# Altium footprint library Package_DFN_QFN.PcbLib: 557 footprints (part 28 of 35)
Each footprint in its own frame and in the unit in brackets; x right, y up, seen from the top. Pads: shape width x height; smd on the part's side, far side on the other; paste and mask are expansions set on the pad; w line width, h text height; cw(c..) or ccw(c..) is an arc to the next point about the centre after c.
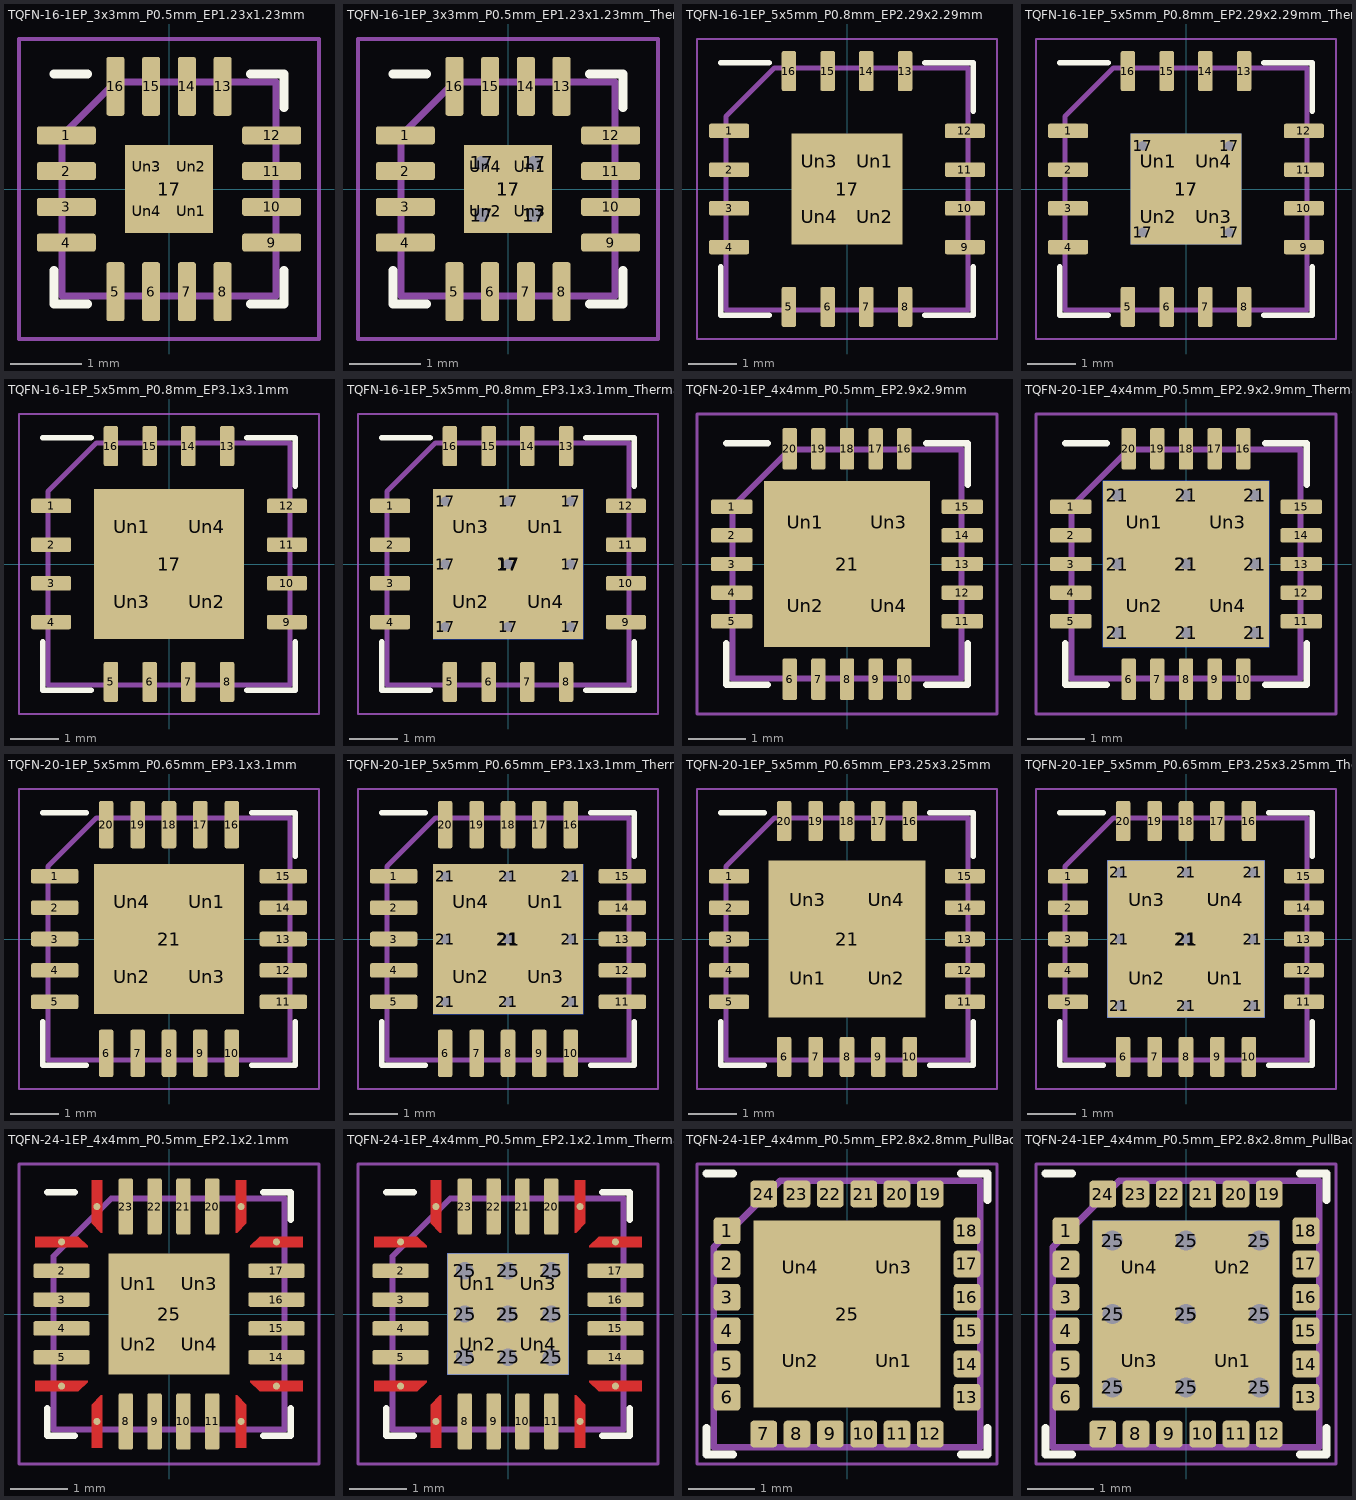
[diagram p27: the footprints below, top view; thin cyan lines are the x and y axes]

## TQFN-16-1EP_3x3mm_P0.5mm_EP1.23x1.23mm [mm]
pads (21):
  rrect25% 0.825x0.25 smd: 1(-1.438,0.75) 2(-1.438,0.25) 3(-1.438,-0.25) 4(-1.438,-0.75) 9(1.438,-0.75) 10(1.438,-0.25) 11(1.438,0.25) 12(1.438,0.75)
  rrect25% 0.25x0.825 smd: 5(-0.75,-1.438) 6(-0.25,-1.438) 7(0.25,-1.438) 8(0.75,-1.438) 13(0.75,1.438) 14(0.25,1.438) 15(-0.25,1.438) 16(-0.75,1.438)
  rect 1.23x1.23 smd: 17(0,0)
  rrect25% 0.5x0.5 on Top Paste: Un1(0.31,-0.31) Un2(0.31,0.31) Un3(-0.31,0.31) Un4(-0.31,-0.31)
F.SilkS:
  lines w0.12: -1.61,-1.135 -1.61,-1.61 -1.135,-1.61 ; -1.61,1.61 -1.135,1.61 ; 1.135,-1.61 1.61,-1.61 1.61,-1.135 ; 1.135,1.61 1.61,1.61 1.61,1.135
F.CrtYd:
  lines w0.05: -2.1,-2.1 -2.1,2.1 2.1,2.1 2.1,-2.1 -2.1,-2.1
F.Fab:
  lines w0.1: -1.5,-1.5 -1.5,0.75 -0.75,1.5 1.5,1.5 1.5,-1.5 -1.5,-1.5
  text "'.Designator'" at -3.033,-0.628 h0.75

## TQFN-16-1EP_3x3mm_P0.5mm_EP1.23x1.23mm_ThermalVias [mm]
pads (26):
  rrect25% 0.825x0.25 smd: 1(-1.438,0.75) 2(-1.438,0.25) 3(-1.438,-0.25) 4(-1.438,-0.75) 9(1.438,-0.75) 10(1.438,-0.25) 11(1.438,0.25) 12(1.438,0.75)
  rrect25% 0.25x0.825 smd: 5(-0.75,-1.438) 6(-0.25,-1.438) 7(0.25,-1.438) 8(0.75,-1.438) 13(0.75,1.438) 14(0.25,1.438) 15(-0.25,1.438) 16(-0.75,1.438)
  round 0.5 hole 0.2: 17(-0.365,-0.365) 17(-0.365,0.365) 17(0.365,-0.365) 17(0.365,0.365)
  rect 1.23x1.23 smd: 17(0,0)
  rect 1.23x1.23 smd far side: 17(0,0)
  rrect25% 0.53x0.53 on Top Paste: Un1(0.31,0.31) Un2(-0.31,-0.31) Un3(0.31,-0.31) Un4(-0.31,0.31)
F.SilkS:
  lines w0.12: -1.61,-1.135 -1.61,-1.61 -1.135,-1.61 ; -1.61,1.61 -1.135,1.61 ; 1.135,-1.61 1.61,-1.61 1.61,-1.135 ; 1.135,1.61 1.61,1.61 1.61,1.135
F.CrtYd:
  lines w0.05: -2.1,-2.1 -2.1,2.1 2.1,2.1 2.1,-2.1 -2.1,-2.1
F.Fab:
  lines w0.1: -1.5,-1.5 1.5,-1.5 1.5,1.5 -0.75,1.5 -1.5,0.75 -1.5,-1.5
  text "'.Designator'" at -3.033,-0.628 h0.75

## TQFN-16-1EP_5x5mm_P0.8mm_EP2.29x2.29mm [mm]
pads (21):
  rrect25% 0.825x0.3 smd: 1(-2.438,1.2) 2(-2.438,0.4) 3(-2.438,-0.4) 4(-2.438,-1.2) 9(2.438,-1.2) 10(2.438,-0.4) 11(2.438,0.4) 12(2.438,1.2)
  rrect25% 0.3x0.825 smd: 5(-1.2,-2.438) 6(-0.4,-2.438) 7(0.4,-2.438) 8(1.2,-2.438) 13(1.2,2.438) 14(0.4,2.438) 15(-0.4,2.438) 16(-1.2,2.438)
  rect 2.29x2.29 smd: 17(0,0)
  rrect25% 0.92x0.92 on Top Paste: Un1(0.57,0.57) Un2(0.57,-0.57) Un3(-0.57,0.57) Un4(-0.57,-0.57)
F.SilkS:
  lines w0.12: -2.61,-1.61 -2.61,-2.61 -1.61,-2.61 ; -2.61,2.61 -1.61,2.61 ; 1.61,-2.61 2.61,-2.61 2.61,-1.61 ; 1.61,2.61 2.61,2.61 2.61,1.61
F.CrtYd:
  lines w0.05: -3.1,-3.1 -3.1,3.1 3.1,3.1 3.1,-3.1 -3.1,-3.1
F.Fab:
  lines w0.1: -2.5,-2.5 2.5,-2.5 2.5,2.5 -1.5,2.5 -2.5,1.5 -2.5,-2.5
  text "'.Designator'" at -4.047,-0.84 h1

## TQFN-16-1EP_5x5mm_P0.8mm_EP2.29x2.29mm_ThermalVias [mm]
pads (26):
  rrect25% 0.825x0.3 smd: 1(-2.438,1.2) 2(-2.438,0.4) 3(-2.438,-0.4) 4(-2.438,-1.2) 9(2.438,-1.2) 10(2.438,-0.4) 11(2.438,0.4) 12(2.438,1.2)
  rrect25% 0.3x0.825 smd: 5(-1.2,-2.438) 6(-0.4,-2.438) 7(0.4,-2.438) 8(1.2,-2.438) 13(1.2,2.438) 14(0.4,2.438) 15(-0.4,2.438) 16(-1.2,2.438)
  round 0.5 hole 0.2: 17(-0.895,-0.895) 17(-0.895,0.895) 17(0.895,-0.895) 17(0.895,0.895)
  rect 2.29x2.29 smd far side: 17(0,0)
  rect 2.29x2.29 smd: 17(0,0)
  rrect25% 0.99x0.99 on Top Paste: Un1(-0.57,0.57) Un2(-0.57,-0.57) Un3(0.57,-0.57) Un4(0.57,0.57)
F.SilkS:
  lines w0.12: -2.61,-1.61 -2.61,-2.61 -1.61,-2.61 ; -2.61,2.61 -1.61,2.61 ; 1.61,-2.61 2.61,-2.61 2.61,-1.61 ; 1.61,2.61 2.61,2.61 2.61,1.61
F.CrtYd:
  lines w0.05: -3.1,-3.1 -3.1,3.1 3.1,3.1 3.1,-3.1 -3.1,-3.1
F.Fab:
  lines w0.1: -2.5,-2.5 -2.5,1.5 -1.5,2.5 2.5,2.5 2.5,-2.5 -2.5,-2.5
  text "'.Designator'" at -4.047,-0.84 h1

## TQFN-16-1EP_5x5mm_P0.8mm_EP3.1x3.1mm [mm]
pads (21):
  rrect25% 0.825x0.3 smd: 1(-2.438,1.2) 2(-2.438,0.4) 3(-2.438,-0.4) 4(-2.438,-1.2) 9(2.438,-1.2) 10(2.438,-0.4) 11(2.438,0.4) 12(2.438,1.2)
  rrect25% 0.3x0.825 smd: 5(-1.2,-2.438) 6(-0.4,-2.438) 7(0.4,-2.438) 8(1.2,-2.438) 13(1.2,2.438) 14(0.4,2.438) 15(-0.4,2.438) 16(-1.2,2.438)
  rect 3.1x3.1 smd: 17(0,0)
  rrect20% 1.25x1.25 on Top Paste: Un1(-0.775,0.775) Un2(0.775,-0.775) Un3(-0.775,-0.775) Un4(0.775,0.775)
F.SilkS:
  lines w0.12: -2.61,-1.61 -2.61,-2.61 -1.61,-2.61 ; -2.61,2.61 -1.61,2.61 ; 1.61,-2.61 2.61,-2.61 2.61,-1.61 ; 1.61,2.61 2.61,2.61 2.61,1.61
F.CrtYd:
  lines w0.05: -3.1,-3.1 3.1,-3.1 3.1,3.1 -3.1,3.1 -3.1,-3.1
F.Fab:
  lines w0.1: -2.5,-2.5 -2.5,1.5 -1.5,2.5 2.5,2.5 2.5,-2.5 -2.5,-2.5
  text "'.Designator'" at -4.047,-0.84 h1

## TQFN-16-1EP_5x5mm_P0.8mm_EP3.1x3.1mm_ThermalVias [mm]
pads (31):
  rrect25% 0.825x0.3 smd: 1(-2.438,1.2) 2(-2.438,0.4) 3(-2.438,-0.4) 4(-2.438,-1.2) 9(2.438,-1.2) 10(2.438,-0.4) 11(2.438,0.4) 12(2.438,1.2)
  rrect25% 0.3x0.825 smd: 5(-1.2,-2.438) 6(-0.4,-2.438) 7(0.4,-2.438) 8(1.2,-2.438) 13(1.2,2.438) 14(0.4,2.438) 15(-0.4,2.438) 16(-1.2,2.438)
  round 0.5 hole 0.2: 17(-1.3,-1.3) 17(-1.3,0) 17(-1.3,1.3) 17(0,-1.3) 17(0,0) 17(0,1.3) 17(1.3,-1.3) 17(1.3,0) 17(1.3,1.3)
  rect 3.1x3.1 smd: 17(0,0)
  rect 3.1x3.1 smd far side: 17(0,0)
  rrect19% 1.34x1.34 on Top Paste: Un1(0.775,0.775) Un2(-0.775,-0.775) Un3(-0.775,0.775) Un4(0.775,-0.775)
F.SilkS:
  lines w0.12: -2.61,-1.61 -2.61,-2.61 -1.61,-2.61 ; -2.61,2.61 -1.61,2.61 ; 1.61,-2.61 2.61,-2.61 2.61,-1.61 ; 1.61,2.61 2.61,2.61 2.61,1.61
F.CrtYd:
  lines w0.05: -3.1,-3.1 -3.1,3.1 3.1,3.1 3.1,-3.1 -3.1,-3.1
F.Fab:
  lines w0.1: -2.5,-2.5 2.5,-2.5 2.5,2.5 -1.5,2.5 -2.5,1.5 -2.5,-2.5
  text "'.Designator'" at -4.047,-0.84 h1

## TQFN-20-1EP_4x4mm_P0.5mm_EP2.9x2.9mm [mm]
pads (25):
  rrect25% 0.725x0.25 smd: 1(-2.013,1) 2(-2.013,0.5) 3(-2.013,0) 4(-2.013,-0.5) 5(-2.013,-1) 11(2.013,-1) 12(2.013,-0.5) 13(2.013,0) 14(2.013,0.5) 15(2.013,1)
  rrect25% 0.25x0.725 smd: 6(-1,-2.013) 7(-0.5,-2.013) 8(0,-2.013) 9(0.5,-2.013) 10(1,-2.013) 16(1,2.013) 17(0.5,2.013) 18(0,2.013) 19(-0.5,2.013) 20(-1,2.013)
  rect 2.9x2.9 smd: 21(0,0)
  rrect21% 1.17x1.17 on Top Paste: Un1(-0.725,0.725) Un2(-0.725,-0.725) Un3(0.725,0.725) Un4(0.725,-0.725)
F.SilkS:
  lines w0.12: -2.11,-1.385 -2.11,-2.11 -1.385,-2.11 ; -2.11,2.11 -1.385,2.11 ; 1.385,-2.11 2.11,-2.11 2.11,-1.385 ; 1.385,2.11 2.11,2.11 2.11,1.385
F.CrtYd:
  lines w0.05: -2.62,-2.62 -2.62,2.62 2.62,2.62 2.62,-2.62 -2.62,-2.62
F.Fab:
  lines w0.1: -2,-2 2,-2 2,2 -1,2 -2,1 -2,-2
  text "'.Designator'" at -4.047,-0.84 h1

## TQFN-20-1EP_4x4mm_P0.5mm_EP2.9x2.9mm_ThermalVias [mm]
pads (35):
  rrect25% 0.725x0.25 smd: 1(-2.013,1) 2(-2.013,0.5) 3(-2.013,0) 4(-2.013,-0.5) 5(-2.013,-1) 11(2.013,-1) 12(2.013,-0.5) 13(2.013,0) 14(2.013,0.5) 15(2.013,1)
  rrect25% 0.25x0.725 smd: 6(-1,-2.013) 7(-0.5,-2.013) 8(0,-2.013) 9(0.5,-2.013) 10(1,-2.013) 16(1,2.013) 17(0.5,2.013) 18(0,2.013) 19(-0.5,2.013) 20(-1,2.013)
  round 0.5 hole 0.2: 21(-1.2,-1.2) 21(-1.2,0) 21(-1.2,1.2) 21(0,-1.2) 21(0,0) 21(0,1.2) 21(1.2,-1.2) 21(1.2,0) 21(1.2,1.2)
  rect 2.9x2.9 smd: 21(0,0)
  rect 2.9x2.9 smd far side: 21(0,0)
  rrect20% 1.26x1.26 on Top Paste: Un1(-0.725,0.725) Un2(-0.725,-0.725) Un3(0.725,0.725) Un4(0.725,-0.725)
F.SilkS:
  lines w0.12: -2.11,-1.385 -2.11,-2.11 -1.385,-2.11 ; -2.11,2.11 -1.385,2.11 ; 1.385,-2.11 2.11,-2.11 2.11,-1.385 ; 1.385,2.11 2.11,2.11 2.11,1.385
F.CrtYd:
  lines w0.05: -2.62,-2.62 -2.62,2.62 2.62,2.62 2.62,-2.62 -2.62,-2.62
F.Fab:
  lines w0.1: -2,-2 2,-2 2,2 -1,2 -2,1 -2,-2
  text "'.Designator'" at -4.047,-0.84 h1

## TQFN-20-1EP_5x5mm_P0.65mm_EP3.1x3.1mm [mm]
pads (25):
  rrect25% 0.975x0.3 smd: 1(-2.362,1.3) 2(-2.362,0.65) 3(-2.362,0) 4(-2.362,-0.65) 5(-2.362,-1.3) 11(2.362,-1.3) 12(2.362,-0.65) 13(2.362,0) 14(2.362,0.65) 15(2.362,1.3)
  rrect25% 0.3x0.975 smd: 6(-1.3,-2.362) 7(-0.65,-2.362) 8(0,-2.362) 9(0.65,-2.362) 10(1.3,-2.362) 16(1.3,2.362) 17(0.65,2.362) 18(0,2.362) 19(-0.65,2.362) 20(-1.3,2.362)
  rect 3.1x3.1 smd: 21(0,0)
  rrect20% 1.25x1.25 on Top Paste: Un1(0.775,0.775) Un2(-0.775,-0.775) Un3(0.775,-0.775) Un4(-0.775,0.775)
F.SilkS:
  lines w0.12: -2.61,-1.71 -2.61,-2.61 -1.71,-2.61 ; -2.61,2.61 -1.71,2.61 ; 1.71,-2.61 2.61,-2.61 2.61,-1.71 ; 1.71,2.61 2.61,2.61 2.61,1.71
F.CrtYd:
  lines w0.05: -3.1,-3.1 3.1,-3.1 3.1,3.1 -3.1,3.1 -3.1,-3.1
F.Fab:
  lines w0.1: -2.5,-2.5 -2.5,1.5 -1.5,2.5 2.5,2.5 2.5,-2.5 -2.5,-2.5
  text "'.Designator'" at -4.047,-0.84 h1

## TQFN-20-1EP_5x5mm_P0.65mm_EP3.1x3.1mm_ThermalVias [mm]
pads (35):
  rrect25% 0.975x0.3 smd: 1(-2.362,1.3) 2(-2.362,0.65) 3(-2.362,0) 4(-2.362,-0.65) 5(-2.362,-1.3) 11(2.362,-1.3) 12(2.362,-0.65) 13(2.362,0) 14(2.362,0.65) 15(2.362,1.3)
  rrect25% 0.3x0.975 smd: 6(-1.3,-2.362) 7(-0.65,-2.362) 8(0,-2.362) 9(0.65,-2.362) 10(1.3,-2.362) 16(1.3,2.362) 17(0.65,2.362) 18(0,2.362) 19(-0.65,2.362) 20(-1.3,2.362)
  round 0.5 hole 0.2: 21(-1.3,-1.3) 21(-1.3,0) 21(-1.3,1.3) 21(0,-1.3) 21(0,0) 21(0,1.3) 21(1.3,-1.3) 21(1.3,0) 21(1.3,1.3)
  rect 3.1x3.1 smd: 21(0,0)
  rect 3.1x3.1 smd far side: 21(0,0)
  rrect19% 1.34x1.34 on Top Paste: Un1(0.775,0.775) Un2(-0.775,-0.775) Un3(0.775,-0.775) Un4(-0.775,0.775)
F.SilkS:
  lines w0.12: -2.61,-1.71 -2.61,-2.61 -1.71,-2.61 ; -2.61,2.61 -1.71,2.61 ; 1.71,-2.61 2.61,-2.61 2.61,-1.71 ; 1.71,2.61 2.61,2.61 2.61,1.71
F.CrtYd:
  lines w0.05: -3.1,-3.1 3.1,-3.1 3.1,3.1 -3.1,3.1 -3.1,-3.1
F.Fab:
  lines w0.1: -2.5,-2.5 2.5,-2.5 2.5,2.5 -1.5,2.5 -2.5,1.5 -2.5,-2.5
  text "'.Designator'" at -4.047,-0.84 h1

## TQFN-20-1EP_5x5mm_P0.65mm_EP3.25x3.25mm [mm]
pads (25):
  rrect25% 0.825x0.3 smd: 1(-2.438,1.3) 2(-2.438,0.65) 3(-2.438,0) 4(-2.438,-0.65) 5(-2.438,-1.3) 11(2.438,-1.3) 12(2.438,-0.65) 13(2.438,0) 14(2.438,0.65) 15(2.438,1.3)
  rrect25% 0.3x0.825 smd: 6(-1.3,-2.438) 7(-0.65,-2.438) 8(0,-2.438) 9(0.65,-2.438) 10(1.3,-2.438) 16(1.3,2.438) 17(0.65,2.438) 18(0,2.438) 19(-0.65,2.438) 20(-1.3,2.438)
  rect 3.25x3.25 smd: 21(0,0)
  rrect19% 1.31x1.31 on Top Paste: Un1(-0.81,-0.81) Un2(0.81,-0.81) Un3(-0.81,0.81) Un4(0.81,0.81)
F.SilkS:
  lines w0.12: -2.61,-1.71 -2.61,-2.61 -1.71,-2.61 ; -2.61,2.61 -1.71,2.61 ; 1.71,-2.61 2.61,-2.61 2.61,-1.71 ; 1.71,2.61 2.61,2.61 2.61,1.71
F.CrtYd:
  lines w0.05: -3.1,-3.1 -3.1,3.1 3.1,3.1 3.1,-3.1 -3.1,-3.1
F.Fab:
  lines w0.1: -2.5,-2.5 2.5,-2.5 2.5,2.5 -1.5,2.5 -2.5,1.5 -2.5,-2.5
  text "'.Designator'" at -4.047,-0.84 h1

## TQFN-20-1EP_5x5mm_P0.65mm_EP3.25x3.25mm_ThermalVias [mm]
pads (35):
  rrect25% 0.825x0.3 smd: 1(-2.438,1.3) 2(-2.438,0.65) 3(-2.438,0) 4(-2.438,-0.65) 5(-2.438,-1.3) 11(2.438,-1.3) 12(2.438,-0.65) 13(2.438,0) 14(2.438,0.65) 15(2.438,1.3)
  rrect25% 0.3x0.825 smd: 6(-1.3,-2.438) 7(-0.65,-2.438) 8(0,-2.438) 9(0.65,-2.438) 10(1.3,-2.438) 16(1.3,2.438) 17(0.65,2.438) 18(0,2.438) 19(-0.65,2.438) 20(-1.3,2.438)
  round 0.5 hole 0.2: 21(-1.375,-1.375) 21(-1.375,0) 21(-1.375,1.375) 21(0,-1.375) 21(0,0) 21(0,1.375) 21(1.375,-1.375) 21(1.375,0) 21(1.375,1.375)
  rect 3.25x3.25 smd far side: 21(0,0)
  rect 3.25x3.25 smd: 21(0,0)
  rrect18% 1.41x1.41 on Top Paste: Un1(0.81,-0.81) Un2(-0.81,-0.81) Un3(-0.81,0.81) Un4(0.81,0.81)
F.SilkS:
  lines w0.12: -2.61,-1.71 -2.61,-2.61 -1.71,-2.61 ; -2.61,2.61 -1.71,2.61 ; 1.71,-2.61 2.61,-2.61 2.61,-1.71 ; 1.71,2.61 2.61,2.61 2.61,1.71
F.CrtYd:
  lines w0.05: -3.1,-3.1 3.1,-3.1 3.1,3.1 -3.1,3.1 -3.1,-3.1
F.Fab:
  lines w0.1: -2.5,-2.5 -2.5,1.5 -1.5,2.5 2.5,2.5 2.5,-2.5 -2.5,-2.5
  text "'.Designator'" at -4.047,-0.84 h1

## TQFN-24-1EP_4x4mm_P0.5mm_EP2.1x2.1mm [mm]
pads (29):
  round 0.123 smd: 1(-1.863,1.25) 6(-1.863,-1.25) 7(-1.25,-1.863) 12(1.25,-1.863) 13(1.863,-1.25) 18(1.863,1.25) 19(1.25,1.863) 24(-1.25,1.863)
  rrect25% 0.975x0.25 smd: 2(-1.863,0.75) 3(-1.863,0.25) 4(-1.863,-0.25) 5(-1.863,-0.75) 14(1.863,-0.75) 15(1.863,-0.25) 16(1.863,0.25) 17(1.863,0.75)
  rrect25% 0.25x0.975 smd: 8(-0.75,-1.863) 9(-0.25,-1.863) 10(0.25,-1.863) 11(0.75,-1.863) 20(0.75,1.863) 21(0.25,1.863) 22(-0.25,1.863) 23(-0.75,1.863)
  rect 2.1x2.1 smd: 25(0,0)
  rrect25% 0.85x0.85 on Top Paste: Un1(-0.525,0.525) Un2(-0.525,-0.525) Un3(0.525,0.525) Un4(0.525,-0.525)
F.Cu:
  region: -1.41,1.181 -1.41,1.16 -2.315,1.16 -2.315,1.34 -1.569,1.34
  region: -1.41,-1.181 -1.569,-1.34 -2.315,-1.34 -2.315,-1.16 -1.41,-1.16
  region: -1.16,-2.315 -1.34,-2.315 -1.34,-1.569 -1.181,-1.41 -1.16,-1.41
  region: 1.34,-1.569 1.34,-2.315 1.16,-2.315 1.16,-1.41 1.181,-1.41
  region: 2.315,-1.34 1.569,-1.34 1.41,-1.181 1.41,-1.16 2.315,-1.16
  region: 2.315,1.16 1.41,1.16 1.41,1.181 1.569,1.34 2.315,1.34
  region: 1.34,1.569 1.181,1.41 1.16,1.41 1.16,2.315 1.34,2.315
  region: -1.16,1.41 -1.181,1.41 -1.34,1.569 -1.34,2.315 -1.16,2.315
F.SilkS:
  lines w0.12: -2.11,-1.635 -2.11,-2.11 -1.635,-2.11 ; -2.11,2.11 -1.635,2.11 ; 1.635,-2.11 2.11,-2.11 2.11,-1.635 ; 1.635,2.11 2.11,2.11 2.11,1.635
F.Paste:
  region: -1.41,1.181 -1.41,1.16 -2.315,1.16 -2.315,1.34 -1.569,1.34
  region: -1.41,-1.181 -1.569,-1.34 -2.315,-1.34 -2.315,-1.16 -1.41,-1.16
  region: -1.16,-2.315 -1.34,-2.315 -1.34,-1.569 -1.181,-1.41 -1.16,-1.41
  region: 1.34,-1.569 1.34,-2.315 1.16,-2.315 1.16,-1.41 1.181,-1.41
  region: 2.315,-1.34 1.569,-1.34 1.41,-1.181 1.41,-1.16 2.315,-1.16
  region: 2.315,1.16 1.41,1.16 1.41,1.181 1.569,1.34 2.315,1.34
  region: 1.34,1.569 1.181,1.41 1.16,1.41 1.16,2.315 1.34,2.315
  region: -1.16,1.41 -1.181,1.41 -1.34,1.569 -1.34,2.315 -1.16,2.315
F.Mask:
  region: -1.41,1.181 -1.41,1.16 -2.315,1.16 -2.315,1.34 -1.569,1.34
  region: -1.41,-1.181 -1.569,-1.34 -2.315,-1.34 -2.315,-1.16 -1.41,-1.16
  region: -1.16,-2.315 -1.34,-2.315 -1.34,-1.569 -1.181,-1.41 -1.16,-1.41
  region: 1.34,-1.569 1.34,-2.315 1.16,-2.315 1.16,-1.41 1.181,-1.41
  region: 2.315,-1.34 1.569,-1.34 1.41,-1.181 1.41,-1.16 2.315,-1.16
  region: 2.315,1.16 1.41,1.16 1.41,1.181 1.569,1.34 2.315,1.34
  region: 1.34,1.569 1.181,1.41 1.16,1.41 1.16,2.315 1.34,2.315
  region: -1.16,1.41 -1.181,1.41 -1.34,1.569 -1.34,2.315 -1.16,2.315
F.CrtYd:
  lines w0.05: -2.6,-2.6 -2.6,2.6 2.6,2.6 2.6,-2.6 -2.6,-2.6
F.Fab:
  lines w0.1: -2,-2 2,-2 2,2 -1,2 -2,1 -2,-2
  text "'.Designator'" at -4.047,-0.84 h1

## TQFN-24-1EP_4x4mm_P0.5mm_EP2.1x2.1mm_ThermalVias [mm]
pads (39):
  round 0.123 smd: 1(-1.863,1.25) 6(-1.863,-1.25) 7(-1.25,-1.863) 12(1.25,-1.863) 13(1.863,-1.25) 18(1.863,1.25) 19(1.25,1.863) 24(-1.25,1.863)
  rrect25% 0.975x0.25 smd: 2(-1.863,0.75) 3(-1.863,0.25) 4(-1.863,-0.25) 5(-1.863,-0.75) 14(1.863,-0.75) 15(1.863,-0.25) 16(1.863,0.25) 17(1.863,0.75)
  rrect25% 0.25x0.975 smd: 8(-0.75,-1.863) 9(-0.25,-1.863) 10(0.25,-1.863) 11(0.75,-1.863) 20(0.75,1.863) 21(0.25,1.863) 22(-0.25,1.863) 23(-0.75,1.863)
  round 0.6 hole 0.3: 25(-0.75,-0.75) 25(-0.75,0) 25(-0.75,0.75) 25(0,-0.75) 25(0,0) 25(0,0.75) 25(0.75,-0.75) 25(0.75,0) 25(0.75,0.75)
  rect 2.1x2.1 smd: 25(0,0)
  rect 2.1x2.1 smd far side: 25(0,0)
  rrect25% 0.85x0.85 on Top Paste: Un1(-0.525,0.525) Un2(-0.525,-0.525) Un3(0.525,0.525) Un4(0.525,-0.525)
F.Cu:
  region: -1.41,1.181 -1.41,1.16 -2.315,1.16 -2.315,1.34 -1.569,1.34
  region: -1.41,-1.181 -1.569,-1.34 -2.315,-1.34 -2.315,-1.16 -1.41,-1.16
  region: -1.16,-2.315 -1.34,-2.315 -1.34,-1.569 -1.181,-1.41 -1.16,-1.41
  region: 1.34,-1.569 1.34,-2.315 1.16,-2.315 1.16,-1.41 1.181,-1.41
  region: 2.315,-1.34 1.569,-1.34 1.41,-1.181 1.41,-1.16 2.315,-1.16
  region: 2.315,1.16 1.41,1.16 1.41,1.181 1.569,1.34 2.315,1.34
  region: 1.34,1.569 1.181,1.41 1.16,1.41 1.16,2.315 1.34,2.315
  region: -1.16,1.41 -1.181,1.41 -1.34,1.569 -1.34,2.315 -1.16,2.315
F.SilkS:
  lines w0.12: -2.11,-1.635 -2.11,-2.11 -1.635,-2.11 ; -2.11,2.11 -1.635,2.11 ; 1.635,-2.11 2.11,-2.11 2.11,-1.635 ; 1.635,2.11 2.11,2.11 2.11,1.635
F.Paste:
  region: -1.41,1.181 -1.41,1.16 -2.315,1.16 -2.315,1.34 -1.569,1.34
  region: -1.41,-1.181 -1.569,-1.34 -2.315,-1.34 -2.315,-1.16 -1.41,-1.16
  region: -1.16,-2.315 -1.34,-2.315 -1.34,-1.569 -1.181,-1.41 -1.16,-1.41
  region: 1.34,-1.569 1.34,-2.315 1.16,-2.315 1.16,-1.41 1.181,-1.41
  region: 2.315,-1.34 1.569,-1.34 1.41,-1.181 1.41,-1.16 2.315,-1.16
  region: 2.315,1.16 1.41,1.16 1.41,1.181 1.569,1.34 2.315,1.34
  region: 1.34,1.569 1.181,1.41 1.16,1.41 1.16,2.315 1.34,2.315
  region: -1.16,1.41 -1.181,1.41 -1.34,1.569 -1.34,2.315 -1.16,2.315
F.Mask:
  region: -1.41,1.181 -1.41,1.16 -2.315,1.16 -2.315,1.34 -1.569,1.34
  region: -1.41,-1.181 -1.569,-1.34 -2.315,-1.34 -2.315,-1.16 -1.41,-1.16
  region: -1.16,-2.315 -1.34,-2.315 -1.34,-1.569 -1.181,-1.41 -1.16,-1.41
  region: 1.34,-1.569 1.34,-2.315 1.16,-2.315 1.16,-1.41 1.181,-1.41
  region: 2.315,-1.34 1.569,-1.34 1.41,-1.181 1.41,-1.16 2.315,-1.16
  region: 2.315,1.16 1.41,1.16 1.41,1.181 1.569,1.34 2.315,1.34
  region: 1.34,1.569 1.181,1.41 1.16,1.41 1.16,2.315 1.34,2.315
  region: -1.16,1.41 -1.181,1.41 -1.34,1.569 -1.34,2.315 -1.16,2.315
F.CrtYd:
  lines w0.05: -2.6,-2.6 -2.6,2.6 2.6,2.6 2.6,-2.6 -2.6,-2.6
F.Fab:
  lines w0.1: -2,-2 2,-2 2,2 -1,2 -2,1 -2,-2
  text "'.Designator'" at -4.047,-0.84 h1

## TQFN-24-1EP_4x4mm_P0.5mm_EP2.8x2.8mm_PullBack [mm]
pads (29):
  rrect25% 0.4x0.4 smd: 1(-1.8,1.25) 2(-1.8,0.75) 3(-1.8,0.25) 4(-1.8,-0.25) 5(-1.8,-0.75) 6(-1.8,-1.25) 7(-1.25,-1.8) 8(-0.75,-1.8) 9(-0.25,-1.8) 10(0.25,-1.8) 11(0.75,-1.8) 12(1.25,-1.8) 13(1.8,-1.25) 14(1.8,-0.75) 15(1.8,-0.25) 16(1.8,0.25) 17(1.8,0.75) 18(1.8,1.25) 19(1.25,1.8) 20(0.75,1.8) 21(0.25,1.8) 22(-0.25,1.8) 23(-0.75,1.8) 24(-1.25,1.8)
  rect 2.8x2.8 smd: 25(0,0)
  rrect22% 1.13x1.13 on Top Paste: Un1(0.7,-0.7) Un2(-0.7,-0.7) Un3(0.7,0.7) Un4(-0.7,0.7)
F.SilkS:
  lines w0.12: -2.11,-1.71 -2.11,-2.11 -1.71,-2.11 ; -2.11,2.11 -1.71,2.11 ; 1.71,-2.11 2.11,-2.11 2.11,-1.71 ; 1.71,2.11 2.11,2.11 2.11,1.71
F.CrtYd:
  lines w0.05: -2.25,-2.25 -2.25,2.25 2.25,2.25 2.25,-2.25 -2.25,-2.25
F.Fab:
  lines w0.1: -2,-2 -2,1 -1,2 2,2 2,-2 -2,-2
  text "'.Designator'" at -4.047,-0.84 h1

## TQFN-24-1EP_4x4mm_P0.5mm_EP2.8x2.8mm_PullBack_ThermalVias [mm]
pads (39):
  rrect25% 0.4x0.4 smd: 1(-1.8,1.25) 2(-1.8,0.75) 3(-1.8,0.25) 4(-1.8,-0.25) 5(-1.8,-0.75) 6(-1.8,-1.25) 7(-1.25,-1.8) 8(-0.75,-1.8) 9(-0.25,-1.8) 10(0.25,-1.8) 11(0.75,-1.8) 12(1.25,-1.8) 13(1.8,-1.25) 14(1.8,-0.75) 15(1.8,-0.25) 16(1.8,0.25) 17(1.8,0.75) 18(1.8,1.25) 19(1.25,1.8) 20(0.75,1.8) 21(0.25,1.8) 22(-0.25,1.8) 23(-0.75,1.8) 24(-1.25,1.8)
  round 0.6 hole 0.3: 25(-1.1,-1.1) 25(-1.1,0) 25(-1.1,1.1) 25(0,-1.1) 25(0,0) 25(0,1.1) 25(1.1,-1.1) 25(1.1,0) 25(1.1,1.1)
  rect 2.8x2.8 smd: 25(0,0)
  rect 2.8x2.8 smd far side: 25(0,0)
  rrect22% 1.13x1.13 on Top Paste: Un1(0.7,-0.7) Un2(0.7,0.7) Un3(-0.7,-0.7) Un4(-0.7,0.7)
F.SilkS:
  lines w0.12: -2.11,-1.71 -2.11,-2.11 -1.71,-2.11 ; -2.11,2.11 -1.71,2.11 ; 1.71,-2.11 2.11,-2.11 2.11,-1.71 ; 1.71,2.11 2.11,2.11 2.11,1.71
F.CrtYd:
  lines w0.05: -2.25,-2.25 2.25,-2.25 2.25,2.25 -2.25,2.25 -2.25,-2.25
F.Fab:
  lines w0.1: -2,-2 -2,1 -1,2 2,2 2,-2 -2,-2
  text "'.Designator'" at -4.047,-0.84 h1